# Altium footprint library Cyberdeck.PcbLib: 261 footprints (part 15 of 17)
Each footprint in its own frame and in the unit in brackets; x right, y up, seen from the top. Pads: shape width x height; smd on the part's side, far side on the other; paste and mask are expansions set on the pad; w line width, h text height; cw(c..) or ccw(c..) is an arc to the next point about the centre after c.
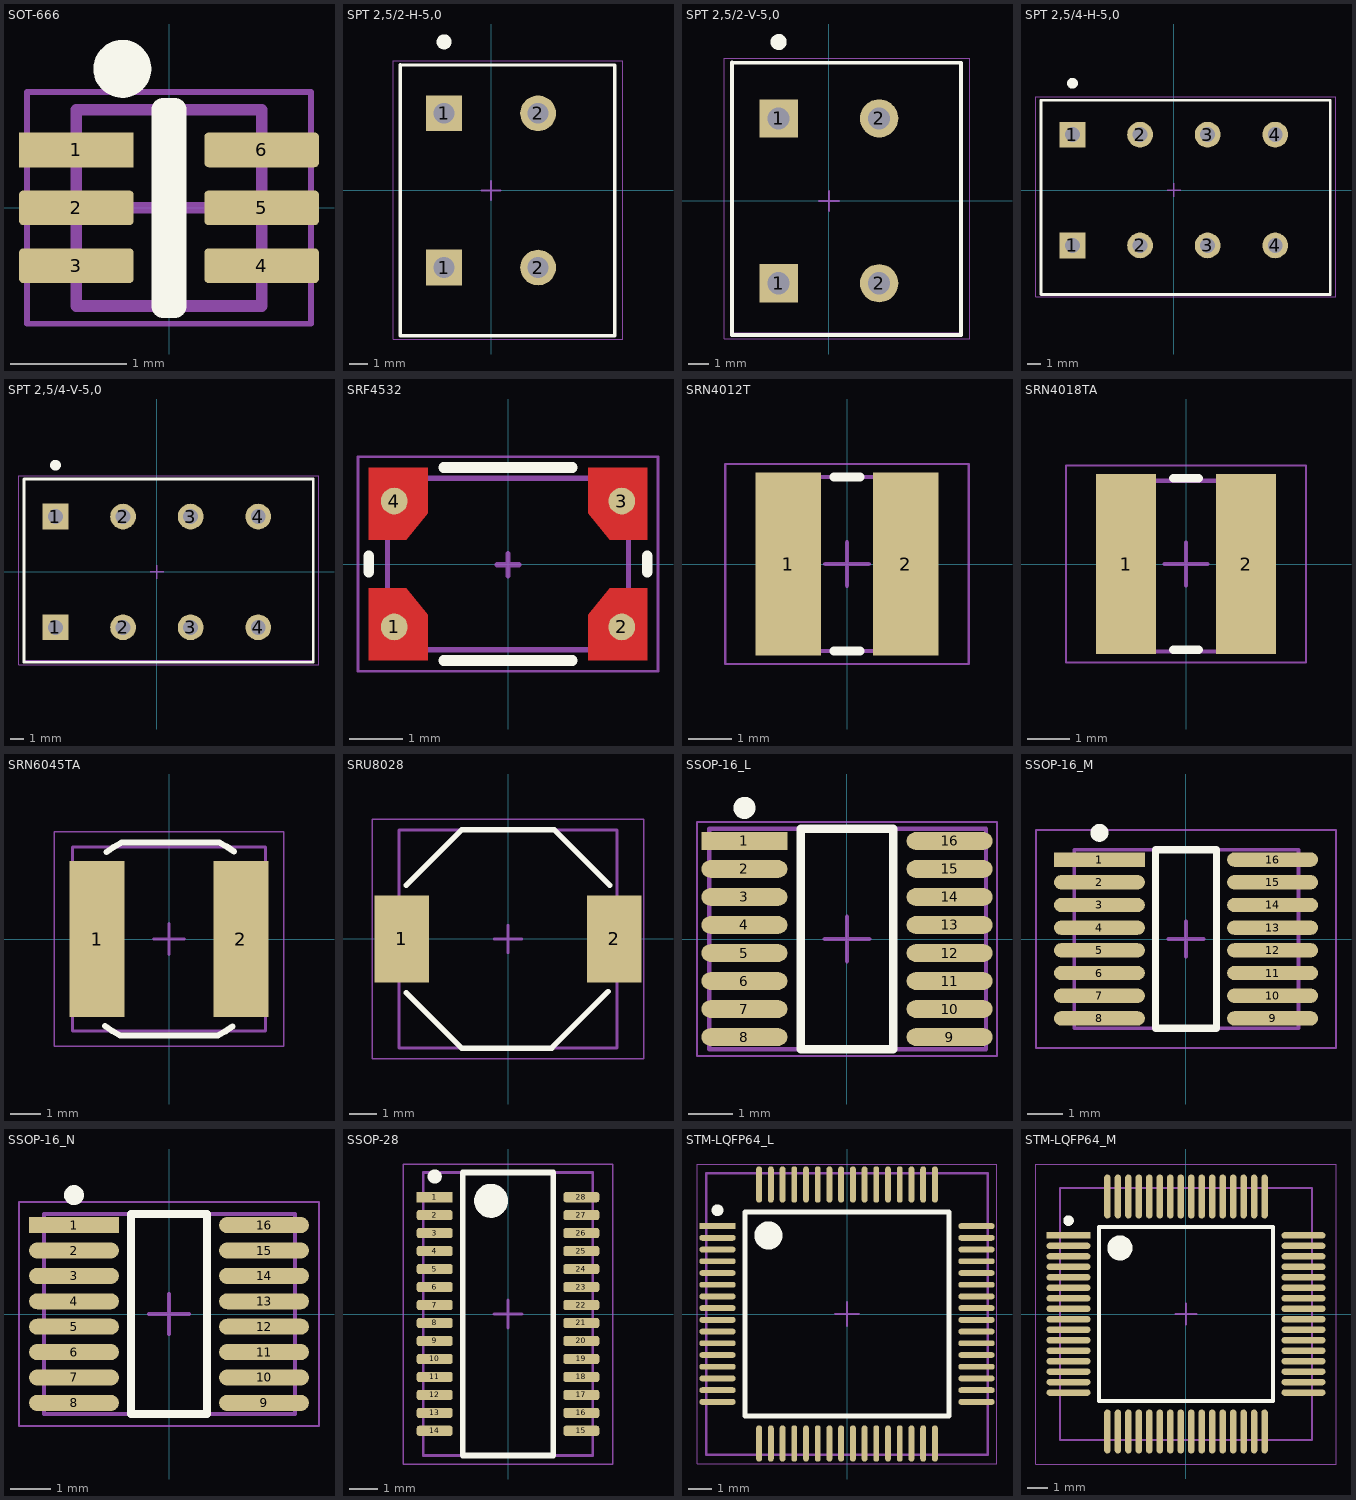
[diagram p14: the footprints below, top view; thin cyan lines are the x and y axes]

## SOT-666 [mm] "SOTFL, 6-Leads, Body 1.60x1.60mm, Pitch 0.50mm, IPC Medium Density"
height 0.6
pads (6):
  rect 0.99x0.3 smd: 1(-0.8,0.5)
  rrect25% 0.99x0.3 smd: 2(-0.8,0) 3(-0.8,-0.5) 4(0.8,-0.5) 5(0.8,0) 6(0.8,0.5)
Top Overlay:
  circle w0.25: c-0.403,1.2 r0.125
  lines w0.2: -0.05,-0.85 0.05,-0.85 0.05,0.85 -0.05,0.85 -0.05,-0.85
Assembly Top:
  lines w0.1: -0.8,-0.848 -0.8,0.848 0.8,0.848 0.8,-0.848 -0.8,-0.848
Courtyard Top:
  lines w0.05: -1.225,-1 -1.225,1 1.225,1 1.225,-1 -1.225,-1
  lines w0.1: -0.5,0 0.5,0 ; 0,-0.5 0,0.5
3D body "SOTFL50P160X60-6N.step": height 0.6, standoff 0, extent -0.8,-0.848 0.8,0.848

## SPT 2,5/2-H-5,0 [mm] "SPT 2,5/2-H-5,0"
height 13.5
pads (4):
  rect 1.9x1.9 hole 1.1: 1(-2.5,-4.1) 1(-2.5,4.1)
  round 1.9 hole 1.1: 2(2.5,-4.1) 2(2.5,4.1)
Top Overlay:
  circle w0.5: c-2.5,7.9 r0.15
  lines w0.2: 6.575,-7.725 6.575,6.65 -4.825,6.675 -4.825,-7.725 6.575,-7.725 ; 6.575,-7.725 6.575,-7.725 ; 6.575,-7.725 6.575,-7.725
Assembly Top:
  lines w0.1: -4.825,-7.725 -4.825,6.675 6.575,6.675 6.575,-7.725 -4.825,-7.725
Courtyard Top:
  lines w0.05: -5.2,-7.9 -5.2,6.9 7,6.9 7,-7.9 -5.2,-7.9
  lines w0.1: -0.5,0 0.5,0 ; 0,-0.5 0,0.5
3D body "1990973_00.stp": height 13.51, standoff -2.49, extent -4.825,-7.725 6.575,6.675

## SPT 2,5/2-V-5,0 [mm] "SPT 2,5/2-V-5,0"
height 14.4
pads (4):
  rect 1.9x1.9 hole 1.1: 1(-2.5,-4.1) 1(-2.5,4.1)
  round 1.9 hole 1.1: 2(2.5,-4.1) 2(2.5,4.1)
Top Overlay:
  circle w0.5: c-2.5,7.9 r0.15
  lines w0.2: -4.825,-6.675 6.575,-6.675 6.575,6.853 -4.825,6.878 -4.825,-6.675
Assembly Top:
  lines w0.1: -4.825,-6.6 6.6,-6.6 6.6,6.875 -4.825,6.875 -4.825,-6.6
Courtyard Top:
  lines w0.05: -5.2,-6.875 -5.2,7.1 7,7.1 7,-6.875 -5.2,-6.875
  lines w0.1: -0.5,0 0.5,0 ; 0,-0.5 0,0.5
3D body "1991095_00.stp": height 14.41, standoff -2.59, extent -4.825,-6.6 6.575,6.9

## SPT 2,5/4-H-5,0 [mm] "SPT 2,5/4-H-5,0"
height 13.5
pads (8):
  rect 1.9x1.9 hole 1.1: 1(-7.5,-4.1) 1(-7.5,4.1)
  round 1.9 hole 1.1: 2(-2.5,-4.1) 2(-2.5,4.1) 3(2.5,-4.1) 3(2.5,4.1) 4(7.5,-4.1) 4(7.5,4.1)
Top Overlay:
  circle w0.5: c-7.5,7.9 r0.15
  lines w0.2: 11.575,-7.725 -9.825,-7.725 -9.825,6.653 11.575,6.653 11.575,-7.725 ; 11.575,-7.725 11.575,-7.725
Assembly Top:
  lines w0.1: -9.825,-7.675 11.575,-7.675 11.575,6.675 -9.825,6.675 -9.825,-7.625 -9.825,-7.675
Courtyard Top:
  lines w0.05: -10.2,-7.9 -10.2,6.9 12,6.9 12,-7.9 -10.2,-7.9
  lines w0.1: -0.5,0 0.5,0 ; 0,-0.5 0,0.5
3D body "1990999_00.stp": height 13.51, standoff -2.49, extent -9.825,-7.725 11.575,6.675

## SPT 2,5/4-V-5,0 [mm] "SPT 2,5/4-V-5,0"
height 14.4
pads (8):
  rect 1.9x1.9 hole 1.1: 1(-7.5,-4.1) 1(-7.5,4.1)
  round 1.9 hole 1.1: 2(-2.5,-4.1) 2(-2.5,4.1) 3(2.5,-4.1) 3(2.5,4.1) 4(7.5,-4.1) 4(7.5,4.1)
Top Overlay:
  circle w0.5: c-7.5,7.9 r0.15
  lines w0.2: -9.825,-6.675 -9.825,6.878 11.575,6.878 11.575,-6.675 -9.825,-6.675
Assembly Top:
  lines w0.1: -9.825,-6.575 -9.825,6.875 11.55,6.875 11.55,-6.575 -9.825,-6.575
Courtyard Top:
  lines w0.05: -10.2,-6.875 12,-6.875 12,7.1 -10.2,7.1 -10.2,-6.875
  lines w0.1: -0.5,0 0.5,0 ; 0,-0.5 0,0.5
3D body "1991118_00.stp": height 14.41, standoff -2.59, extent -9.825,-6.6 11.575,6.9

## SRF4532 [mm] "Common Mode Chip Inductors"
height 3
pads (4):
  round 0.5 smd: 1(-2.125,-1.175) 2(2.125,-1.175) 3(2.125,1.175) 4(-2.125,1.175)
Top Layer:
  region: -1.5,1.8 -2.6,1.8 -2.6,0.45 -1.9,0.45 -1.5,0.95
  region: 1.5,1.8 2.6,1.8 2.6,0.45 1.9,0.45 1.5,0.95
  region: 1.5,-1.8 2.6,-1.8 2.6,-0.45 1.9,-0.45 1.5,-0.95
  region: -1.5,-1.8 -2.6,-1.8 -2.6,-0.45 -1.9,-0.45 -1.5,-0.95
Top Overlay:
  lines w0.2: -2.6,-0.15 -2.6,0.15 ; -1.2,-1.8 1.2,-1.8 ; -1.2,1.8 1.2,1.8 ; 2.6,-0.15 2.6,0.15
Top Paste:
  region: -1.5,1.8 -1.5,0.95 -1.9,0.45 -2.6,0.45 -2.6,1.8
  region: 1.5,1.8 1.5,0.95 1.9,0.45 2.6,0.45 2.6,1.8
  region: 1.5,-1.8 1.5,-0.95 1.9,-0.45 2.6,-0.45 2.6,-1.8
  region: -1.5,-1.8 -1.5,-0.95 -1.9,-0.45 -2.6,-0.45 -2.6,-1.8
Assembly Top:
  lines w0.1: -2.25,-1.6 2.25,-1.6 2.25,1.6 -2.25,1.6 -2.25,-1.6
Courtyard Top:
  lines w0.05: -2.8,-2 2.8,-2 2.8,2 -2.8,2 -2.8,-2
  lines w0.1: -0.203,-0.015 0.203,-0.015 ; 0,-0.218 0,0.188
3D body "SRF4532.stp": height 2.81, standoff 0.01, extent -2.25,-1.6 2.25,1.6

## SRN4012T [mm] "SRN4012T Series - Semi-shielded Power Inductors"
height 1.2
pads (2):
  rect 1.5x4.2 smd: 1(-1.35,0) 2(1.35,0)
Top Overlay:
  lines w0.2: -0.3,-2 0.3,-2 ; -0.3,2 0.3,2
Assembly Top:
  lines w0.1: -2,-2 2.01,-2 2.01,2 -2,2 -2,-2
Courtyard Top:
  lines w0.05: -2.8,-2.3 -2.8,2.3 2.8,2.3 2.8,-2.3 -2.8,-2.3
  lines w0.1: -0.5,0 0.5,0 ; 0,-0.5 0,0.5
3D body "SRN4012T.stp": height 1.22, standoff 0.01, extent -2.01,-2.01 2.01,2.01

## SRN4018TA [mm] "SRN4018TA Series - Semi-shielded Power Inductors"
height 1.8
pads (2):
  rect 1.4x4.2 smd: 1(-1.4,0) 2(1.4,0)
Top Overlay:
  lines w0.2: -0.3,-2 0.3,-2 ; -0.3,2 0.3,2
Assembly Top:
  lines w0.1: -2,-2.044 -2,1.944 2.01,1.944 2.01,-2.044 -2,-2.044
Courtyard Top:
  lines w0.05: -2.8,-2.3 2.8,-2.3 2.8,2.3 -2.8,2.3 -2.8,-2.3
  lines w0.1: -0.5,0 0.5,0 ; 0,-0.5 0,0.5
3D body "SRN4018TA.stp": height 1.82, standoff 0.01, extent -2.019,-2.044 1.969,1.944

## SRN6045TA [mm] "SRN6045TA Series - Semi-shielded Power Inductors"
height 4.2
pads (2):
  rect 1.8x5.1 smd: 1(-2.35,0) 2(2.35,0)
Top Overlay:
  lines w0.2: -2.093,-2.841 ccw(c0,-0.05) -1.6,-3.15 1.6,-3.15 ccw(c0,-0.05) 2.074,-2.855 ; -2.043,2.841 cw(c0.05,0.05) -1.55,3.15 1.65,3.15 cw(c0.05,0.05) 2.124,2.855
Assembly Top:
  lines w0.1: -3.15,-3 3.15,-3 3.15,3 -3.15,3 -3.15,-3
Courtyard Top:
  lines w0.05: -3.75,-3.5 3.75,-3.5 3.75,3.5 -3.75,3.5 -3.75,-3.5
  lines w0.1: -0.5,0 0.5,0 ; 0,-0.5 0,0.5
3D body "User Library-SRN6045 Series.step": height 4.51, standoff 0.01, extent -3.15,-3 3.15,3

## SRU8028 [mm] "SRU8028 Series - Shielded Power Inductors, IPC Medium Density"
height 3.1
pads (2):
  rect 2x3.2 smd: 1(-3.9,0) 2(3.9,0)
Top Overlay:
  lines w0.2: -3.725,-1.975 -1.7,-4 1.6,-4 3.675,-1.925 ; -3.725,1.975 -1.7,4 1.7,4 3.725,1.975
Assembly Top:
  lines w0.1: -4,-4 -4,4 4,4 4,-4 -4,-4
Courtyard Top:
  lines w0.05: -4.975,-4.4 4.975,-4.4 4.975,4.4 -4.975,4.4 -4.975,-4.4
  lines w0.1: -0.5,0 0.5,0 ; 0,-0.5 0,0.5
3D body "sru8028.stp": height 2.81, standoff 0.01, extent -4,-4 4,4

## SSOP-16_L [mm] "SOP, 16-Leads, Body 4.9x3.9mm, Pitch 0.635mm, IPC High Density"
height 1.76
pads (16):
  rect 1.95x0.4 smd: 1(-2.325,2.222)
  oval 1.95x0.4 smd: 2(-2.325,1.587) 3(-2.325,0.953) 4(-2.325,0.318) 5(-2.325,-0.318) 6(-2.325,-0.953) 7(-2.325,-1.587) 8(-2.325,-2.222) 9(2.325,-2.222) 10(2.325,-1.587) 11(2.325,-0.953) 12(2.325,-0.318) 13(2.325,0.318) 14(2.325,0.953) 15(2.325,1.587) 16(2.325,2.222)
Top Overlay:
  circle w0.25: c-2.325,2.973 r0.125
  lines w0.2: -1.05,-2.5 -1.05,2.5 1.05,2.5 1.05,-2.5 -1.05,-2.5
Assembly Top:
  lines w0.1: -3.125,-2.5 -3.125,2.5 3.15,2.5 3.15,-2.5 -3.125,-2.5
Courtyard Top:
  lines w0.05: -3.4,-2.65 -3.4,2.65 3.4,2.65 3.4,-2.65 -3.4,-2.65
  lines w0.1: -0.5,0 0.5,0 ; 0,-0.5 0,0.5
3D body "User Library-SSOP 16-pin.step": height 1.75, standoff 0.01, extent -3.127,-2.5 3.126,2.5

## SSOP-16_M [mm] "SOP, 16-Leads, Body 4.9x3.9mm, Pitch 0.635mm, IPC Low Density"
height 1.76
pads (16):
  rect 2.55x0.4 smd: 1(-2.425,2.222)
  oval 2.55x0.4 smd: 2(-2.425,1.587) 3(-2.425,0.953) 4(-2.425,0.318) 5(-2.425,-0.318) 6(-2.425,-0.953) 7(-2.425,-1.587) 8(-2.425,-2.222) 9(2.425,-2.222) 10(2.425,-1.587) 11(2.425,-0.953) 12(2.425,-0.318) 13(2.425,0.318) 14(2.425,0.953) 15(2.425,1.587) 16(2.425,2.222)
Top Overlay:
  circle w0.25: c-2.425,2.973 r0.125
  lines w0.2: -0.85,-2.5 0.85,-2.5 0.85,2.5 -0.85,2.5 -0.85,-2.5
Assembly Top:
  lines w0.1: -3.125,-2.5 3.15,-2.5 3.15,2.5 -3.125,2.5 -3.125,-2.5
Courtyard Top:
  lines w0.05: -4.2,-3.05 4.2,-3.05 4.2,3.05 -4.2,3.05 -4.2,-3.05
  lines w0.1: -0.5,0 0.5,0 ; 0,-0.5 0,0.5
3D body "User Library-SSOP 16-pin.step": height 1.75, standoff 0.01, extent -3.126,-2.5 3.127,2.5

## SSOP-16_N [mm] "SOP, 16-Leads, Body 4.9x3.9mm, Pitch 0.635mm, IPC Medium Density"
height 1.76
pads (16):
  rect 2.25x0.4 smd: 1(-2.375,2.222)
  oval 2.25x0.4 smd: 2(-2.375,1.587) 3(-2.375,0.953) 4(-2.375,0.318) 5(-2.375,-0.318) 6(-2.375,-0.953) 7(-2.375,-1.587) 8(-2.375,-2.222) 9(2.375,-2.222) 10(2.375,-1.587) 11(2.375,-0.953) 12(2.375,-0.318) 13(2.375,0.318) 14(2.375,0.953) 15(2.375,1.587) 16(2.375,2.222)
Top Overlay:
  circle w0.25: c-2.375,2.973 r0.125
  lines w0.2: -0.95,-2.5 -0.95,2.5 0.95,2.5 0.95,-2.5 -0.95,-2.5
Assembly Top:
  lines w0.1: -3.125,-2.5 3.15,-2.5 3.15,2.5 -3.125,2.5 -3.125,-2.5
Courtyard Top:
  lines w0.05: -3.75,-2.8 -3.75,2.8 3.75,2.8 3.75,-2.8 -3.75,-2.8
  lines w0.1: -0.5,0 0.5,0 ; 0,-0.5 0,0.5
3D body "User Library-SSOP 16-pin.step": height 1.75, standoff 0.01, extent -3.126,-2.5 3.127,2.5

## SSOP-28 [mm] "SOP, 28-Leads, Body 9.91x3.90mm, Pitch 0.64mm, IPC Medium Density"
height 1.73
pads (28):
  rect 1.27x0.36 smd: 1(-2.59,4.127)
  rrect50% 1.27x0.36 smd: 2(-2.59,3.492) 3(-2.59,2.857) 4(-2.59,2.222) 5(-2.59,1.587) 6(-2.59,0.953) 7(-2.59,0.318) 8(-2.59,-0.318) 9(-2.59,-0.953) 10(-2.59,-1.587) 11(-2.59,-2.222) 12(-2.59,-2.857) 13(-2.59,-3.492) 14(-2.59,-4.127) 15(2.59,-4.127) 16(2.59,-3.492) 17(2.59,-2.857) 18(2.59,-2.222) 19(2.59,-1.587) 20(2.59,-0.953) 21(2.59,-0.318) 22(2.59,0.318) 23(2.59,0.953) 24(2.59,1.587) 25(2.59,2.222) 26(2.59,2.857) 27(2.59,3.492) 28(2.59,4.127)
Top Overlay:
  circle w0.25: c-2.59,4.858 r0.125
  circle w0.6: c-0.6,4 r0.3
  lines w0.2: -1.6,-5 -1.6,5 1.6,5 1.6,-5 -1.6,-5
Assembly Top:
  lines w0.1: -2.997,-5 -2.997,5 2.997,5 2.997,-5 -2.997,-5
Courtyard Top:
  lines w0.05: -3.7,-5.3 -3.7,5.3 3.7,5.3 3.7,-5.3 -3.7,-5.3
  lines w0.1: -0.5,0 0.5,0 ; 0,-0.5 0,0.5
3D body "SSOP-28.step": height 1.73, standoff 0, extent -2.997,-5 2.997,5

## STM-LQFP64_L [mm] "Thin QFP, 64-Leads, Body 10x10mm, Pitch 0.5mm, IPC High Density"
height 1.6
pads (64):
  rect 1.55x0.25 smd: 1(-5.525,3.75)
  oval 1.55x0.25 smd: 2(-5.525,3.25) 3(-5.525,2.75) 4(-5.525,2.25) 5(-5.525,1.75) 6(-5.525,1.25) 7(-5.525,0.75) 8(-5.525,0.25) 9(-5.525,-0.25) 10(-5.525,-0.75) 11(-5.525,-1.25) 12(-5.525,-1.75) 13(-5.525,-2.25) 14(-5.525,-2.75) 15(-5.525,-3.25) 16(-5.525,-3.75) 33(5.525,-3.75) 34(5.525,-3.25) 35(5.525,-2.75) 36(5.525,-2.25) 37(5.525,-1.75) 38(5.525,-1.25) 39(5.525,-0.75) 40(5.525,-0.25) 41(5.525,0.25) 42(5.525,0.75) 43(5.525,1.25) 44(5.525,1.75) 45(5.525,2.25) 46(5.525,2.75) 47(5.525,3.25) 48(5.525,3.75)
  oval 0.25x1.55 smd: 17(-3.75,-5.525) 18(-3.25,-5.525) 19(-2.75,-5.525) 20(-2.25,-5.525) 21(-1.75,-5.525) 22(-1.25,-5.525) 23(-0.75,-5.525) 24(-0.25,-5.525) 25(0.25,-5.525) 26(0.75,-5.525) 27(1.25,-5.525) 28(1.75,-5.525) 29(2.25,-5.525) 30(2.75,-5.525) 31(3.25,-5.525) 32(3.75,-5.525) 49(3.75,5.525) 50(3.25,5.525) 51(2.75,5.525) 52(2.25,5.525) 53(1.75,5.525) 54(1.25,5.525) 55(0.75,5.525) 56(0.25,5.525) 57(-0.25,5.525) 58(-0.75,5.525) 59(-1.25,5.525) 60(-1.75,5.525) 61(-2.25,5.525) 62(-2.75,5.525) 63(-3.25,5.525) 64(-3.75,5.525)
Top Overlay:
  circle w0.25: c-5.525,4.425 r0.125
  circle w0.6: c-3.35,3.35 r0.3
  lines w0.2: -4.35,-4.35 -4.35,4.35 4.35,4.35 4.35,-4.35 -4.35,-4.35
Assembly Top:
  lines w0.1: -6,-6 -6,6 6,6 6,-6 -6,-6
Courtyard Top:
  lines w0.05: -6.4,-6.4 -6.4,6.4 6.4,6.4 6.4,-6.4 -6.4,-6.4
  lines w0.1: -0.5,0 0.5,0 ; 0,-0.5 0,0.5
3D body "TSQFP50P1200X1200X160-64N.step": height 1.6, standoff 0, extent -6,-6 6,6

## STM-LQFP64_M [mm] "Thin QFP, 64-Leads, Body 10x10mm, Pitch 0.5mm, IPC Low Density"
height 1.6
pads (64):
  rect 2.1x0.3 smd: 1(-5.6,3.75)
  oval 2.1x0.3 smd: 2(-5.6,3.25) 3(-5.6,2.75) 4(-5.6,2.25) 5(-5.6,1.75) 6(-5.6,1.25) 7(-5.6,0.75) 8(-5.6,0.25) 9(-5.6,-0.25) 10(-5.6,-0.75) 11(-5.6,-1.25) 12(-5.6,-1.75) 13(-5.6,-2.25) 14(-5.6,-2.75) 15(-5.6,-3.25) 16(-5.6,-3.75) 33(5.6,-3.75) 34(5.6,-3.25) 35(5.6,-2.75) 36(5.6,-2.25) 37(5.6,-1.75) 38(5.6,-1.25) 39(5.6,-0.75) 40(5.6,-0.25) 41(5.6,0.25) 42(5.6,0.75) 43(5.6,1.25) 44(5.6,1.75) 45(5.6,2.25) 46(5.6,2.75) 47(5.6,3.25) 48(5.6,3.75)
  oval 0.3x2.1 smd: 17(-3.75,-5.6) 18(-3.25,-5.6) 19(-2.75,-5.6) 20(-2.25,-5.6) 21(-1.75,-5.6) 22(-1.25,-5.6) 23(-0.75,-5.6) 24(-0.25,-5.6) 25(0.25,-5.6) 26(0.75,-5.6) 27(1.25,-5.6) 28(1.75,-5.6) 29(2.25,-5.6) 30(2.75,-5.6) 31(3.25,-5.6) 32(3.75,-5.6) 49(3.75,5.6) 50(3.25,5.6) 51(2.75,5.6) 52(2.25,5.6) 53(1.75,5.6) 54(1.25,5.6) 55(0.75,5.6) 56(0.25,5.6) 57(-0.25,5.6) 58(-0.75,5.6) 59(-1.25,5.6) 60(-1.75,5.6) 61(-2.25,5.6) 62(-2.75,5.6) 63(-3.25,5.6) 64(-3.75,5.6)
Top Overlay:
  circle w0.25: c-5.6,4.45 r0.125
  circle w0.6: c-3.15,3.15 r0.3
  lines w0.2: -4.15,-4.15 -4.15,4.15 4.15,4.15 4.15,-4.15 -4.15,-4.15
Assembly Top:
  lines w0.1: -6,-6 -6,6 6,6 6,-6 -6,-6
Courtyard Top:
  lines w0.05: -7.15,-7.15 -7.15,7.15 7.15,7.15 7.15,-7.15 -7.15,-7.15
  lines w0.1: -0.5,0 0.5,0 ; 0,-0.5 0,0.5
3D body "TSQFP50P1200X1200X160-64N.step": height 1.6, standoff 0, extent -6,-6 6,6